# Altium schematic symbol library THU VIEN SCH.SchLib: 1083 symbols (part 2 of 5)
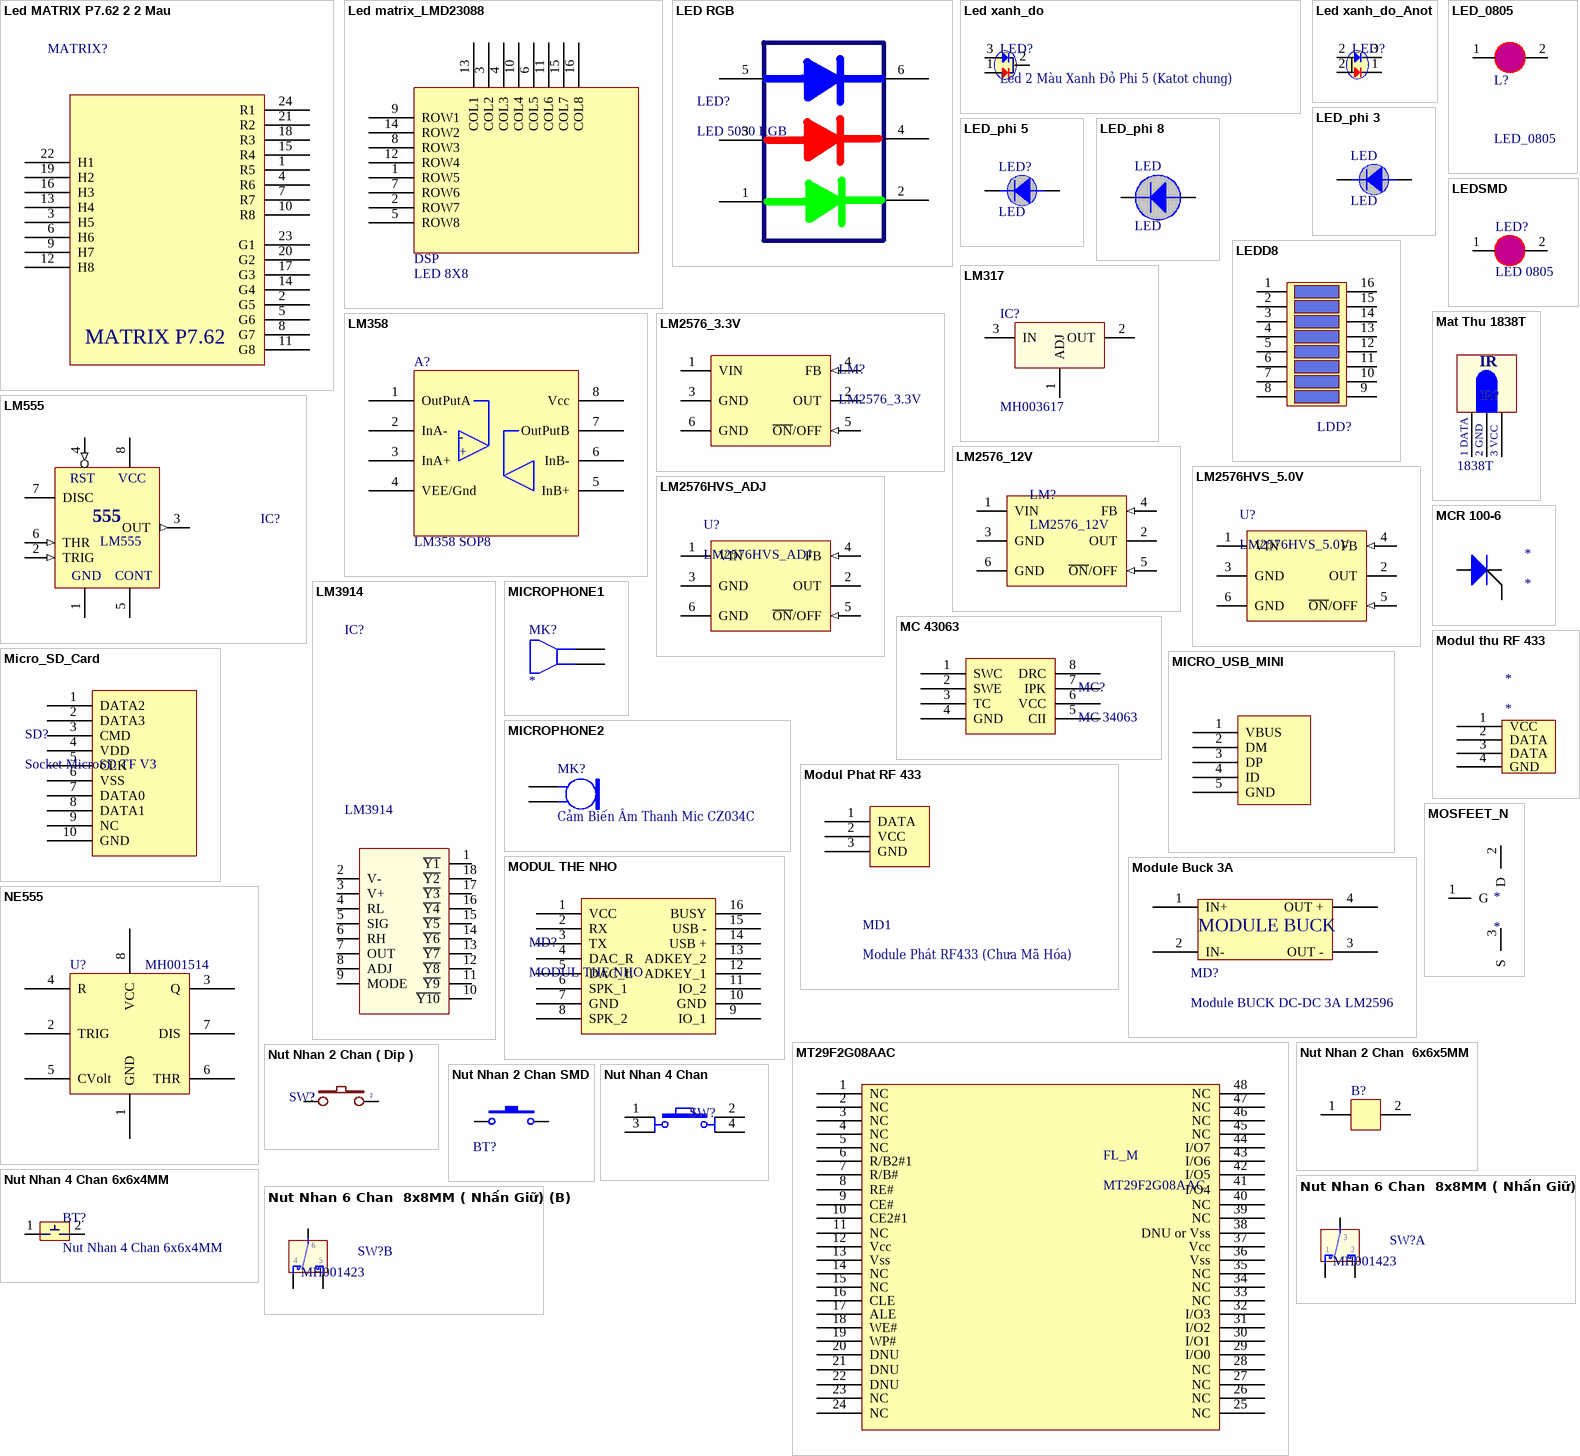
[diagram p36: symbols Led MATRIX P7.62 2 2 Mau to Nut Nhan 6 Chan  8x8MM ( Nhấn Giữ)]

## Module Buck 3A
designator MD?, comment Module BUCK DC-DC 3A LM2596
Cắm; Ten_Linh_Kien: Module BUCK DC-DC 3A LM2596 ADJ; Don_Vi: Con; Ma_Hang: MH002392; Ghi_Chu: *; Kieu_Chan: *; Chung_Loai: Cắm
footprint Module Buck 3A
pins: 1 IN+, 2 IN-, 3 OUT -, 4 OUT +
text: MODULE BUCK

## MOSFEET_N
designator *
pins: 1 G, 2 D, 3 S

## MT29F2G08AAC
designator FL_M
pins: 1 NC, 2 NC, 3 NC, 4 NC, 5 NC, 6 R/B2#1, 7 R/B#, 8 RE#, 9 CE#, 10 CE2#1, 11 NC, 12 Vcc, 13 Vss, 14 NC, 15 NC, 16 CLE, 17 ALE, 18 WE#, 19 WP#, 20 DNU, 21 DNU, 22 DNU, 23 NC, 24 NC, 25 NC, 26 NC, 27 NC, 28 NC, 29 I/O0, 30 I/O1, 31 I/O2, 32 I/O3, 33 NC, 34 NC, 35 NC, 36 Vss, 37 Vcc, 38 DNU or Vss, 39 NC, 40 NC, 41 I/O4, 42 I/O5, 43 I/O6, 44 I/O7, 45 NC, 46 NC, 47 NC, 48 NC

## NE555
designator U?, comment MH001514
Dán; Value: NE555 SOP8
footprint sop 8
pins: 1 GND, 2 TRIG, 3 Q, 4 R, 5 CVolt, 6 THR, 7 DIS, 8 VCC

## Nut Nhan 2 Chan  6x6x5MM
designator B?
Cắm; Ten_Linh_Kien: Nút Nhấn 2 Chân 6x6x5MM DIP; Don_Vi: Con; Ma_Hang: MH001959; Ghi_Chu: *; Kieu_Chan: *; Chung_Loai: Cắm
footprint Button 2 Pin (Button 200mil 2 Pin)
footprint BUTTON SMD 2
pins: 1, 2

## Nut Nhan 2 Chan ( Dip )
designator SW?
Cắm; Ten_Linh_Kien: Nút Nhấn 2 Chân 6x6x5MM DIP; Ma_Hang: MH001959; Don_Vi: Con; Kieu_Chan: *; Ghi_Chu: *; Chung_Loai: Cắm
footprint SW2 (SW button 2pin, 250x 250 mil)
footprint SW-2P-S
pins: 1, 2

## Nut Nhan 2 Chan SMD
designator BT?, comment Nút Nhấn 2 Chân 3x6x2.5MM SMD  (value not drawn)
Dán; Don_Vi: Con; Ma_Hang: MH001036; Ghi_Chu: *; Kieu_Chan: *; Ten_Linh_Kien: Nút Nhấn 2 Chân 3x6x2.5MM SMD; Chung_Loai: Dán
footprint Nut Nhan 2 Chan SMD_N (Switch SMD type)
pins: 1, 2

## Nut Nhan 4 Chan
designator SW?
Cắm; Value: Nút Nhấn 4 Chân 6x6x9MM DIP; Ma_Hang: MH004077; Don_Vi: Con; Kieu Chan: *; Ghi Chu: *
footprint SW4 (SW button 4pin, 250 x250 mil)
footprint SW4B (SW button 4pin, 450 x 450 mil)
footprint SW-4P-S
pins: 1, 2, 3, 4

## Nut Nhan 4 Chan 6x6x4MM
designator BT?
Cắm; Ten_Linh_Kien: Nút Nhấn 4 Chân 6x6x4MM DIP; Ma_Hang: MH005213; Don_Vi: Con; Kieu_Chan: *; Ghi_Chu: *; Chung_Loai: Cắm
footprint button 4 pin (BUTTON SMORE 280mil x 178mil)
pins: 1, 2

## Nut Nhan 6 Chan  8x8MM ( Nhấn Giữ)
designator SW?, comment MH001423
Cắm; Ten_Linh_Kien: Nút Nhấn 6 Chân 8x8MM ( Nhấn Giữ); Don_Vi: Con; Ghi_Chu: *; Kieu_Chan: *; Ma_Hang: MH001423; Chung_Loai: Cắm
footprint SW6 (SW DTDP - 6Pin 260x300x300 mil)
part A pins: 1, 2, 3
part B pins: 4, 5, 6

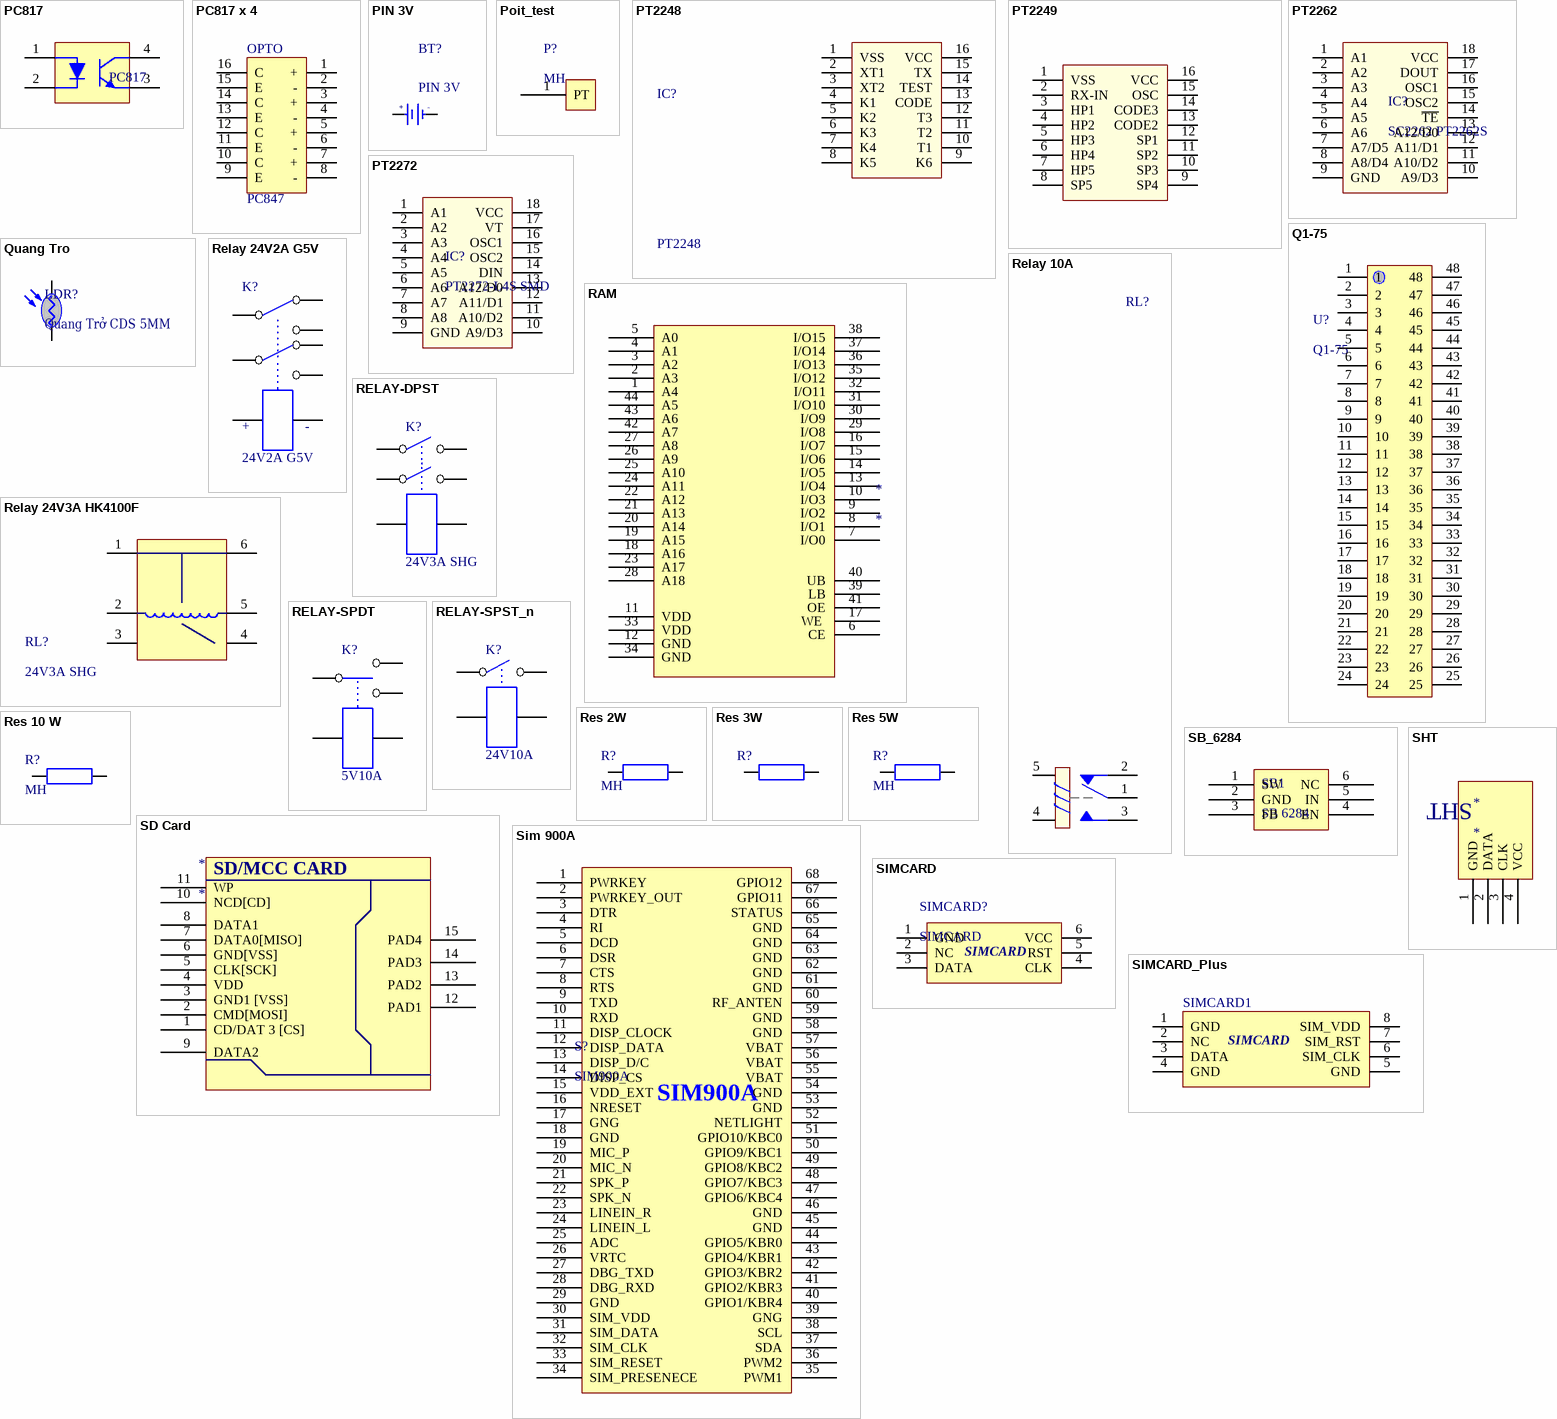
[diagram p7: symbols PC817 to SIMCARD_Plus]

## PC817
designator P?
Dán; Ten_Linh_Kien: PC817/EL817 5V 5mA SMD; Don_Vi: Con; Ma_Hang: MH001134; Ghi_Chu: *; kieu_Chan: *; Chung_Loai: Dán
footprint DIP-4 (DIP; 4 Leads; Row Spacing 7.62 mm; Pitch 2.54 mm)
simulation model 2N3904 (NPN)
signal-integrity model 2N3904
pins: 1, 2, 3, 4

## PC817 x 4
designator OPTO, comment PC847
Cắm; Value: PC847 DIP16; Don_Vi: Con; Ma_Hang: MH003739; Ghi Chu: *; Kieu Chan: *; Chung_Loai: Cắm
footprint DIP-16 (Plastic DIP; 16 Leads; Row Spacing 7.62 mm; Pitch 2.54 mm)
3D model DIP-16_0_2102_U (PCB3D Model)
pins: 1 +, 2 -, 3 +, 4 -, 5 +, 6 -, 7 +, 8 -, 9 E, 10 C, 11 E, 12 C, 13 E, 14 C, 15 E, 16 C

## PIN 3V
designator BT?
Battery 3VDC; Value: PIN 3V
footprint PIN3V (Socket PIN 3V)
footprint PIN 3V-S (Socket PIN 3V)
footprint CR2023 L
pins: 1 +3V, 2 GND
text: +; -

## Poit_test
designator P?, comment MH
Cắm
pins: 1 PT

## PT2248
designator IC?
Cắm; Ten_Linh_Kien: PT2248 DIP16; Don_Vi: Con; Ma_Hang: MH002843; Ghi_Chu: *; Kieu_Chan: *; Chung_Loai: Cắm
footprint DIP16/W0.3 (16 PIN, W 300mil, Pin to pin 100mil)
pins: 1 VSS, 2 XT1, 3 XT2, 4 K1, 5 K2, 6 K3, 7 K4, 8 K5, 9 K6, 10 T1, 11 T2, 12 T3, 13 CODE, 14 TEST, 15 TX, 16 VCC

## PT2249
designator IC?, comment PT2249A
Cắm; Ten_Linh_Kien: PT2249A DIP16; Ma_Hang: MH002842; Don_Vi: Con; Ghi_Chu: *; Kieu_Chan: *; Chung_Loai: Cắm
footprint DIP16/W0.3 (16 PIN, W 300mil, Pin to pin 100mil)
pins: 1 VSS, 2 RX-IN, 3 HP1, 4 HP2, 5 HP3, 6 HP4, 7 HP5, 8 SP5, 9 SP4, 10 SP3, 11 SP2, 12 SP1, 13 CODE2, 14 CODE3, 15 OSC, 16 VCC

## PT2262
designator IC?, comment SC2262 PT2262S
Dán; Don_Vi: Con; Ma_Hang: MH000739; Ten_Linh_Kien: SC2262 PT2262S; Ghi_Chu: *; Kieu_Chan: *; Chung_Loai: Dán
footprint DIP18/W0.3 (18 PIN, W 300mil, Pin to pin 100mil)
pins: 1 A1, 2 A2, 3 A3, 4 A4, 5 A5, 6 A6, 7 A7/D5, 8 A8/D4, 9 GND, 10 A9/D3, 11 A10/D2, 12 A11/D1, 13 A12/D0, 14 ~{TE}, 15 OSC2, 16 OSC1, 17 DOUT, 18 VCC

## PT2272
designator IC?, comment PT2272-L4S SMD
Dán; Don_Vi: Con; Ma_Hang: MH000736; Ten_Linh_Kien: PT2272-L4S SMD; Kieu _Chan: *; Ghi_Chu: *; Chung_Loai: Dán
footprint DIP18/W0.3 (18 PIN, W 300mil, Pin to pin 100mil)
pins: 1 A1, 2 A2, 3 A3, 4 A4, 5 A5, 6 A6, 7 A7, 8 A8, 9 GND, 10 A9/D3, 11 A10/D2, 12 A11/D1, 13 A12/D0, 14 DIN, 15 OSC2, 16 OSC1, 17 VT, 18 VCC

## Q1-75
designator U?
pins: 1, 2, 3, 4, 5, 6, 7, 8, 9, 10, 11, 12, 13, 14, 15, 16, 17, 18, 19, 20, 21, 22, 23, 24, 25, 26, 27, 28, 29, 30, 31, 32, 33, 34, 35, 36, 37, 38, 39, 40, 41, 42, 43, 44, 45, 46, 47, 48

## Quang Tro
designator LDR?, comment Quang Trở CDS 5MM
Cắm; Ten_Linh_Kien: Quang Trở CDS 5MM 5537; Don_Vi: Con; Ma_Hang: MH000544; Ghi_Chu: *; Kieu_Chan: *; Chung_Loai: Cắm
footprint CDS (Footprint not found)
pins: 1 A, 2 K

## RAM
designator *
pins: 1 A4, 2 A3, 3 A2, 4 A1, 5 A0, 6 CE, 7 I/O0, 8 I/O1, 9 I/O2, 10 I/O3, 11 VDD, 12 GND, 13 I/O4, 14 I/O5, 15 I/O6, 16 I/O7, 17 WE , 18 A16, 19 A15, 20 A14, 21 A13, 22 A12, 23 A17, 24 A11, 25 A10, 26 A9, 27 A8, 28 A18, 29 I/O8, 30 I/O9, 31 I/O10, 32 I/O11, 33 VDD, 34 GND, 35 I/O12, 36 I/O13, 37 I/O14, 38 I/O15, 39 LB, 40 UB, 41 OE, 42 A7, 43 A6, 44 A5

## Relay 10A
designator RL?, comment MH  (value not drawn)
Cắm; Value: Relay ?V - 10A
footprint RELAY5PIN-10A
footprint RELAY5PIN-10A
pins: 1, 2, 3, 4, 5

## Relay 24V2A G5V
designator K?, comment 24V2A G5V
Cắm; Ten_Linh_Kien: Relay 24V2A 8 Chân G5V-2-24VDC; Don_Vi: Con; Ma_Hang: MH005637; Chung_Loai: Căm; Kieu_Chan: *; Ghi_Chu: *
footprint RELAY-DP
pins: 1, 2, 3, 4, 5, 6, 7, 8
text: +; -

## Relay 24V3A HK4100F
designator RL?, comment 24V3A SHG
Cắm; Ten_Linh_Kien: Relay 24V3A 6 Chân HK4100F-DC24V-SHG; Ma_Hang: MH001685; Don_Vi: Con; Kieu_Chan: *; Ghi_Chu: *; Chung_Loai: Cắm
footprint RELAY 6_MH (RELAY 6)
pins: 1, 2, 3, 4, 5, 6

## RELAY-DPST
designator K?, comment 24V3A SHG
Cắm; Ten_Linh_Kien: Relay 24V3A 6 Chân HK4100F-DC24V-SHG; Don_Vi: Con; Ma_Hang: MH001685; Kieu_Chan: *; Ghi_Chu: *; Chung_Loai: Cắm
pins: 1, 2, 3, 4, 5, 6

## RELAY-SPDT
designator K?, comment 5V10A
Cắm; Ten_Linh_Kien: Relay 5V10A 5 Chân SRD-05VDC-SL-C; Don_Vi: Con; Ma_Hang: MH001007; Kieu_Chan: *; Ghi _Chu: *; Chung_Loai: Cắm
footprint RELAY_5
pins: 1, 2, 3, 4, 5

## RELAY-SPST_n
designator K?, comment 24V10A
Cắm; Ten_Linh_Kien: Relay 24V10A G5Q-1A-DC24V; Don_Vi: Con; Ma_Hang: MH004501; Kieu_Chan: *; Ghi_Chu: *; Chung_Loai: Cắm
pins: 1, 2, 3, 5 4

## Res 2W
designator R?, comment MH
Cắm; Ten_Linh_Kien: 2W; Don_Vi: Con; Ma_Hang: MH; Ghi _Chu: *; Kieu_Chan: *; Chung_Loai: Cắm
footprint DIEN TRO 2W
pins: 1, 2

## Res 3W
designator R?
Cắm; Ten_Linh_Kien: Mh; Don_Vi: Con; Ghi_Chu: *; Ma_Hang: *; Kieu_Chan: *; Chung_Loai: Cắm
footprint DIEN TRO 3W (tube) (Dien tro 3W dang ong tru)
pins: 1, 2

## Res 5W
designator R?, comment MH
Cắm; Ten_Linh_Kien: 5W; Don_Vi: Con; Ghi_Chu: *; Kieu_Chan: *; Ma_Hang: MH; Chung_Loai: Cắm
footprint DIEN TRO 5W
pins: 1, 2

## Res 10 W
designator R?, comment MH
Cắm; Ten_Linh_Kien: 10W; Kieu_Chan: *; Ghi_Chu: *; Don_Vi: *; Ma_Hang: *; Chung_Loai: Cắm
footprint DIEN TRO 10W
pins: 1, 2

## SB_6284
designator SB1, comment SB 6284
Dán
pins: 1 SW, 2 GND, 3 FB, 4 EN, 5 IN, 6 NC

## SD Card
designator *
pins: 1 CD/DAT 3 [CS], 2 CMD[MOSI], 3 GND1 [VSS], 4 VDD, 5 CLK[SCK], 6 GND[VSS], 7 DATA0[MISO], 8 DATA1, 9 DATA2, 10 NCD[CD], 11 WP, 12 PAD1, 13 PAD2, 14 PAD3, 15 PAD4
text: SD/MCC CARD

## SHT
designator *
pins: 1 GND, 2 DATA, 3 CLK, 4 VCC

## Sim 900A
designator S?, comment SIM900A
Dán; Don_Vi: Con; Ma_Hang: MH001813; Ten_Linh_Kien: SIM900A; Ghi_Chu: *; Kieu_Chan: *; Chung_Loai: Dán
footprint sim900
pins: 1 PWRKEY, 2 PWRKEY_OUT, 3 DTR, 4 RI, 5 DCD, 6 DSR, 7 CTS, 8 RTS, 9 TXD, 10 RXD, 11 DISP_CLOCK, 12 DISP_DATA, 13 DISP_D/C, 14 DISP_CS, 15 VDD_EXT, 16 NRESET, 17 GNG, 18 GND, 19 MIC_P, 20 MIC_N, 21 SPK_P, 22 SPK_N, 23 LINEIN_R, 24 LINEIN_L, 25 ADC, 26 VRTC, 27 DBG_TXD, 28 DBG_RXD, 29 GND, 30 SIM_VDD, 31 SIM_DATA, 32 SIM_CLK, 33 SIM_RESET, 34 SIM_PRESENECE, 35 PWM1, 36 PWM2, 37 SDA, 38 SCL, 39 GNG, 40 GPIO1/KBR4, 41 GPIO2/KBR3, 42 GPIO3/KBR2, 43 GPIO4/KBR1, 44 GPIO5/KBR0, 45 GND, 46 GND, 47 GPIO6/KBC4, 48 GPIO7/KBC3, 49 GPIO8/KBC2, 50 GPIO9/KBC1, 51 GPIO10/KBC0, 52 NETLIGHT, 53 GND, 54 GND, 55 VBAT, 56 VBAT, 57 VBAT, 58 GND, 59 GND, 60 RF_ANTEN, 61 GND, 62 GND, 63 GND, 64 GND, 65 GND, 66 STATUS, 67 GPIO11, 68 GPIO12

## SIMCARD
designator SIMCARD?
footprint SIMCARD (SOCKET Khe Cam The Sim)
pins: 1 GND, 2 NC, 3 DATA, 4 CLK, 5 RST, 6 VCC

## SIMCARD_Plus
designator SIMCARD1  (value not drawn)
footprint SIM Card Plus
pins: 1 GND, 2 NC, 3 DATA, 4 GND, 5 GND, 6 SIM_CLK, 7 SIM_RST, 8 SIM_VDD
text: SIMCARD

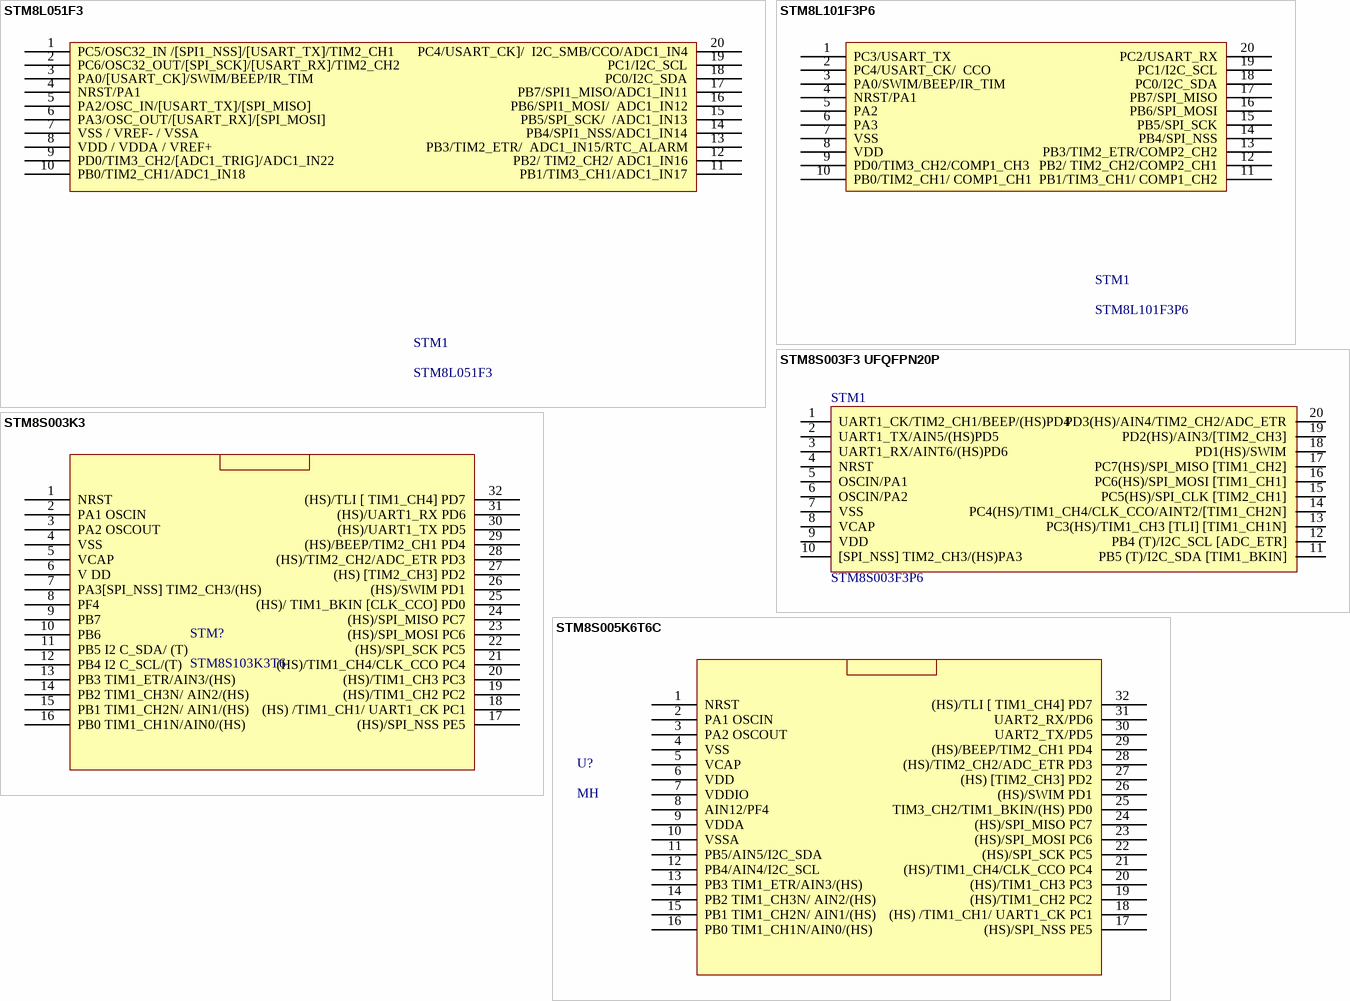
[diagram p8: symbols STM8L051F3 to STM8S005K6T6C]

## STM8L051F3
designator STM1
footprint TSSOP20 (Shrink Small Outline; 20 Leads; Body Width 4.4 mm; Pitch 0.65 mm)
pins: 1 PC5/OSC32_IN /[SPI1_NSS]/[USART_TX]/TIM2_CH1, 2 PC6/OSC32_OUT/[SPI_SCK]/[USART_RX]/TIM2_CH2, 3 PA0/[USART_CK]/SWIM/BEEP/IR_TIM, 4 NRST/PA1, 5 PA2/OSC_IN/[USART_TX]/[SPI_MISO], 6 PA3/OSC_OUT/[USART_RX]/[SPI_MOSI], 7 VSS / VREF- / VSSA , 8 VDD / VDDA / VREF+, 9 PD0/TIM3_CH2/[ADC1_TRIG]/ADC1_IN22, 10 PB0/TIM2_CH1/ADC1_IN18, 11 PB1/TIM3_CH1/ADC1_IN17, 12 PB2/ TIM2_CH2/ ADC1_IN16, 13 PB3/TIM2_ETR/  ADC1_IN15/RTC_ALARM, 14 PB4/SPI1_NSS/ADC1_IN14, 15 PB5/SPI_SCK/  /ADC1_IN13, 16 PB6/SPI1_MOSI/  ADC1_IN12, 17 PB7/SPI1_MISO/ADC1_IN11, 18 PC0/I2C_SDA, 19 PC1/I2C_SCL, 20 PC4/USART_CK]/  I2C_SMB/CCO/ADC1_IN4

## STM8L101F3P6
designator STM1
footprint TSSOP20 (Shrink Small Outline; 20 Leads; Body Width 4.4 mm; Pitch 0.65 mm)
pins: 1 PC3/USART_TX, 2 PC4/USART_CK/  CCO, 3 PA0/SWIM/BEEP/IR_TIM, 4 NRST/PA1, 5 PA2, 6 PA3, 7 VSS, 8 VDD, 9 PD0/TIM3_CH2/COMP1_CH3, 10 PB0/TIM2_CH1/ COMP1_CH1, 11 PB1/TIM3_CH1/ COMP1_CH2, 12 PB2/ TIM2_CH2/COMP2_CH1, 13 PB3/TIM2_ETR/COMP2_CH2, 14  PB4/SPI_NSS, 15  PB5/SPI_SCK, 16  PB6/SPI_MOSI, 17 PB7/SPI_MISO, 18  PC0/I2C_SDA, 19 PC1/I2C_SCL, 20 PC2/USART_RX

## STM8S003F3 UFQFPN20P
designator STM1, comment STM8S003F3P6
Dán; Ten_Linh_Kien: STM8S003F3P6 TSSOP20; Don_Vi: Con; Ma_Hang: MH001918; Kieu_Chan: *; Ghi_Chu: *; Chung_Loai: Dán
footprint TSSOP20 (Shrink Small Outline; 20 Leads; Body Width 4.4 mm; Pitch 0.65 mm)
pins: 1 UART1_CK/TIM2_CH1/BEEP/(HS)PD4, 2 UART1_TX/AIN5/(HS)PD5, 3 UART1_RX/AINT6/(HS)PD6, 4 NRST, 5 OSCIN/PA1, 6 OSCIN/PA2, 7 VSS, 8 VCAP, 9 VDD, 10 [SPI_NSS] TIM2_CH3/(HS)PA3, 11 PB5 (T)/I2C_SDA [TIM1_BKIN], 12 PB4 (T)/I2C_SCL [ADC_ETR], 13 PC3(HS)/TIM1_CH3 [TLI] [TIM1_CH1N], 14 PC4(HS)/TIM1_CH4/CLK_CCO/AINT2/[TIM1_CH2N], 15 PC5(HS)/SPI_CLK [TIM2_CH1], 16 PC6(HS)/SPI_MOSI [TIM1_CH1], 17 PC7(HS)/SPI_MISO [TIM1_CH2], 18 PD1(HS)/SWIM, 19 PD2(HS)/AIN3/[TIM2_CH3], 20 PD3(HS)/AIN4/TIM2_CH2/ADC_ETR

## STM8S003K3
designator STM?, comment STM8S103K3T6
Dán; Ma_Hang: MH001694; Don_Vi: Con; Ten_Linh_Kien: STM8S103K3T6; Ghi_Chu: *; Kieu_Chan: *; Chung_Loai: Dán
footprint 32A_M (Thin QFP, 32-Leads, Body 7x7mm, Pitch 0.8mm, IPC Low Density)
pins: 1 NRST, 2 PA1 OSCIN, 3 PA2 OSCOUT, 4 VSS, 5 VCAP, 6 V DD, 7 PA3[SPI_NSS] TIM2_CH3/(HS), 8 PF4, 9 PB7, 10 PB6, 11 PB5 I2 C_SDA/ (T), 12 PB4 I2 C_SCL/(T), 13 PB3 TIM1_ETR/AIN3/(HS), 14 PB2 TIM1_CH3N/ AIN2/(HS), 15 PB1 TIM1_CH2N/ AIN1/(HS), 16 PB0 TIM1_CH1N/AIN0/(HS), 17 (HS)/SPI_NSS PE5, 18 (HS) /TIM1_CH1/ UART1_CK PC1, 19 (HS)/TIM1_CH2 PC2, 20 (HS)/TIM1_CH3 PC3, 21 (HS)/TIM1_CH4/CLK_CCO PC4, 22 (HS)/SPI_SCK PC5, 23 (HS)/SPI_MOSI PC6, 24 (HS)/SPI_MISO PC7, 25 (HS)/ TIM1_BKIN [CLK_CCO] PD0, 26 (HS)/SWIM PD1, 27 (HS) [TIM2_CH3] PD2, 28 (HS)/TIM2_CH2/ADC_ETR PD3, 29 (HS)/BEEP/TIM2_CH1 PD4, 30 (HS)/UART1_TX PD5, 31 (HS)/UART1_RX PD6, 32 (HS)/TLI [ TIM1_CH4] PD7

## STM8S005K6T6C
designator U?, comment MH
Dán; Value: STM8S005K6T6C
pins: 1 NRST, 2 PA1 OSCIN, 3 PA2 OSCOUT, 4 VSS, 5 VCAP, 6 VDD, 7 VDDIO, 8 AIN12/PF4, 9 VDDA, 10 VSSA, 11 PB5/AIN5/I2C_SDA, 12 PB4/AIN4/I2C_SCL, 13 PB3 TIM1_ETR/AIN3/(HS), 14 PB2 TIM1_CH3N/ AIN2/(HS), 15 PB1 TIM1_CH2N/ AIN1/(HS), 16 PB0 TIM1_CH1N/AIN0/(HS), 17 (HS)/SPI_NSS PE5, 18 (HS) /TIM1_CH1/ UART1_CK PC1, 19 (HS)/TIM1_CH2 PC2, 20 (HS)/TIM1_CH3 PC3, 21 (HS)/TIM1_CH4/CLK_CCO PC4, 22 (HS)/SPI_SCK PC5, 23 (HS)/SPI_MOSI PC6, 24 (HS)/SPI_MISO PC7, 25 TIM3_CH2/TIM1_BKIN/(HS) PD0, 26 (HS)/SWIM PD1, 27 (HS) [TIM2_CH3] PD2, 28 (HS)/TIM2_CH2/ADC_ETR PD3, 29 (HS)/BEEP/TIM2_CH1 PD4, 30 UART2_TX/PD5, 31 UART2_RX/PD6, 32 (HS)/TLI [ TIM1_CH4] PD7

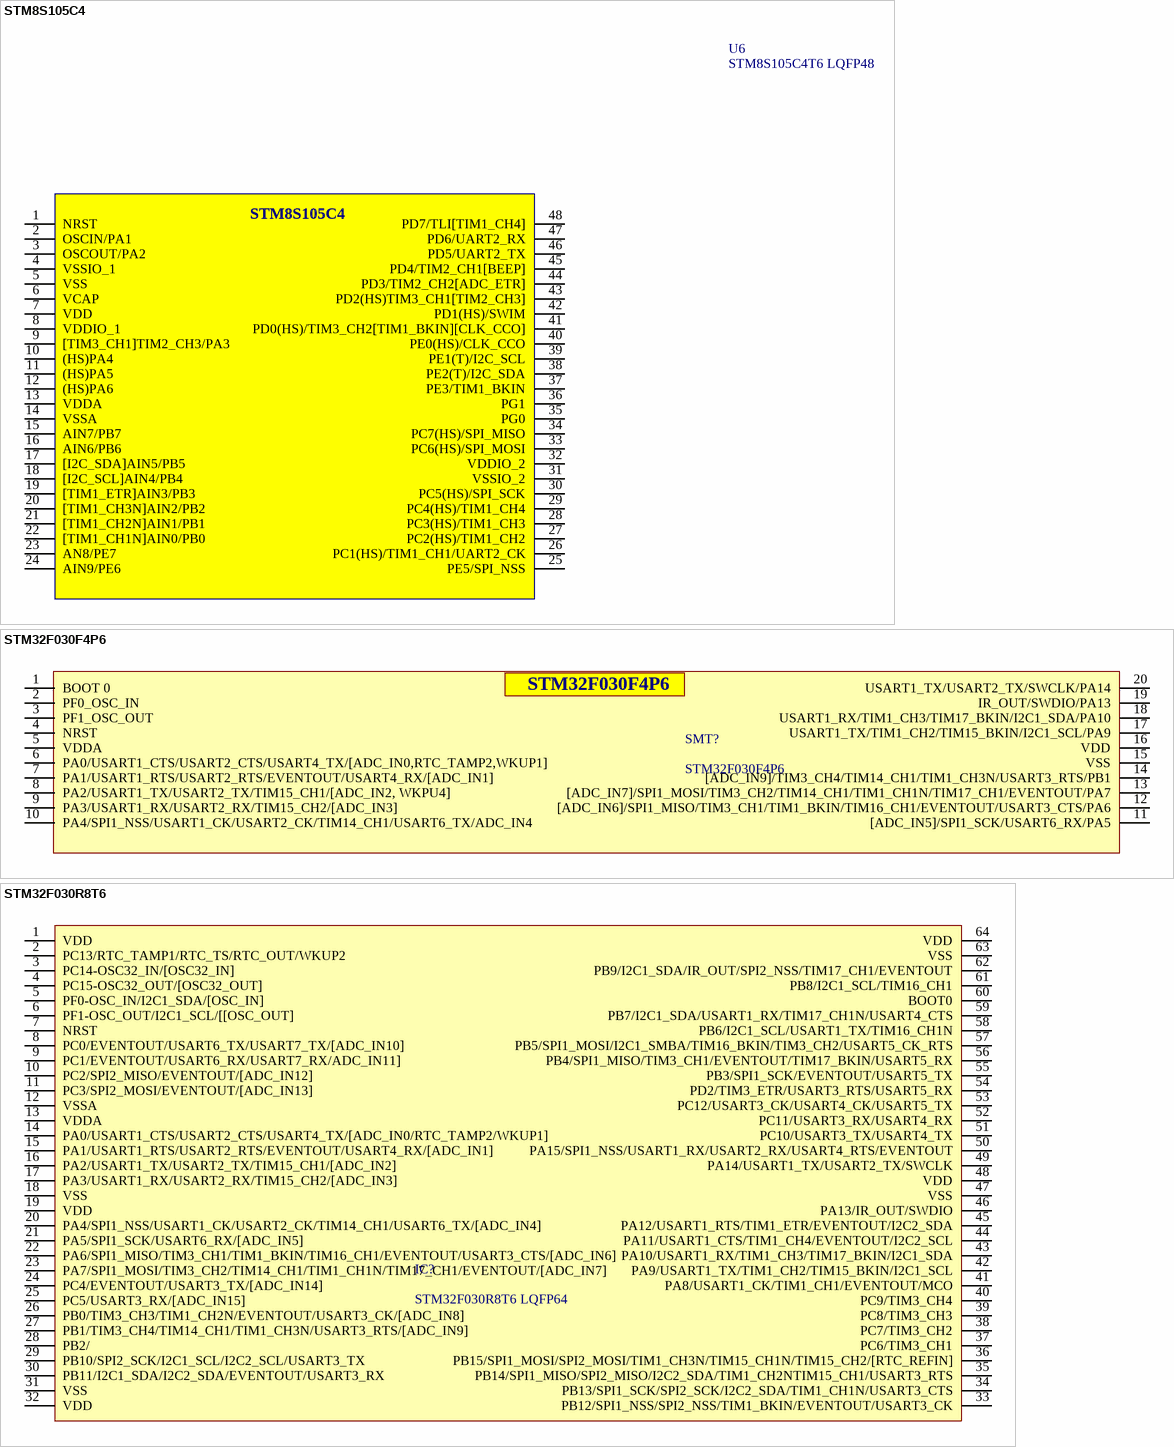
[diagram p9: symbols STM8S105C4 to STM32F030R8T6]

## STM8S105C4
designator U6, comment STM8S105C4T6 LQFP48
Dán; Ma_Hang: MH002597; Don_Vi: Con; Ten_Linh_Kien: STM8S105C4T6 LQFP48; Ghi_Chu: *; Kieu_Chan: *; Chung_Loai: Dán
footprint 48A_M (Thin QFP, 48-Leads, Body 7x7mm, Pitch 0.5mm, IPC Low Density)
pins: 1 NRST, 2 OSCIN/PA1, 3 OSCOUT/PA2, 4 VSSIO_1, 5 VSS, 6 VCAP, 7 VDD, 8 VDDIO_1, 9 [TIM3_CH1]TIM2_CH3/PA3, 10 (HS)PA4, 11 (HS)PA5, 12 (HS)PA6, 13 VDDA, 14 VSSA, 15 AIN7/PB7, 16 AIN6/PB6, 17 [I2C_SDA]AIN5/PB5, 18 [I2C_SCL]AIN4/PB4, 19 [TIM1_ETR]AIN3/PB3, 20 [TIM1_CH3N]AIN2/PB2, 21 [TIM1_CH2N]AIN1/PB1, 22 [TIM1_CH1N]AIN0/PB0, 23 AN8/PE7, 24 AIN9/PE6, 25 PE5/SPI_NSS, 26 PC1(HS)/TIM1_CH1/UART2_CK, 27 PC2(HS)/TIM1_CH2, 28 PC3(HS)/TIM1_CH3, 29 PC4(HS)/TIM1_CH4, 30 PC5(HS)/SPI_SCK, 31 VSSIO_2, 32 VDDIO_2, 33 PC6(HS)/SPI_MOSI, 34 PC7(HS)/SPI_MISO, 35 PG0, 36 PG1, 37 PE3/TIM1_BKIN, 38 PE2(T)/I2C_SDA, 39 PE1(T)/I2C_SCL, 40 PE0(HS)/CLK_CCO, 41 PD0(HS)/TIM3_CH2[TIM1_BKIN][CLK_CCO], 42 PD1(HS)/SWIM, 43 PD2(HS)TIM3_CH1[TIM2_CH3], 44 PD3/TIM2_CH2[ADC_ETR], 45 PD4/TIM2_CH1[BEEP], 46 PD5/UART2_TX, 47 PD6/UART2_RX, 48 PD7/TLI[TIM1_CH4]

## STM32F030F4P6
designator SMT?
footprint TSSOP20 (Shrink Small Outline; 20 Leads; Body Width 4.4 mm; Pitch 0.65 mm)
pins: 1 BOOT 0, 2 PF0_OSC_IN, 3 PF1_OSC_OUT, 4 NRST, 5 VDDA, 6 PA0/USART1_CTS/USART2_CTS/USART4_TX/[ADC_IN0,RTC_TAMP2,WKUP1], 7 PA1/USART1_RTS/USART2_RTS/EVENTOUT/USART4_RX/[ADC_IN1], 8 PA2/USART1_TX/USART2_TX/TIM15_CH1/[ADC_IN2, WKPU4], 9 PA3/USART1_RX/USART2_RX/TIM15_CH2/[ADC_IN3], 10 PA4/SPI1_NSS/USART1_CK/USART2_CK/TIM14_CH1/USART6_TX/ADC_IN4, 11 [ADC_IN5]/SPI1_SCK/USART6_RX/PA5, 12 [ADC_IN6]/SPI1_MISO/TIM3_CH1/TIM1_BKIN/TIM16_CH1/EVENTOUT/USART3_CTS/PA6, 13 [ADC_IN7]/SPI1_MOSI/TIM3_CH2/TIM14_CH1/TIM1_CH1N/TIM17_CH1/EVENTOUT/PA7, 14 [ADC_IN9]/TIM3_CH4/TIM14_CH1/TIM1_CH3N/USART3_RTS/PB1, 15 VSS, 16 VDD, 17 USART1_TX/TIM1_CH2/TIM15_BKIN/I2C1_SCL/PA9, 18 USART1_RX/TIM1_CH3/TIM17_BKIN/I2C1_SDA/PA10, 19 IR_OUT/SWDIO/PA13, 20 USART1_TX/USART2_TX/SWCLK/PA14